# Altium schematic symbol library BARKO_SCHLIB.SchLib: 1064 symbols (part 1 of 11) (continued)
## C-1UF-0603 (continued)
CAP CER 1UF 16V X7R 0603; Manufacturer: TDK; Manufacturer Part Number: C1608X7R1C105K080AC; Dielectric Material: Ceramic; Tolerance: 10%; .PCBCHK: USED; .Creator: M.OZKAN; Washability: OK; Supplier 1: Digi-Key; Supplier Part Number 1: 445-1604-1-ND; Stock 1: 0; Pricing 1: 1=0.1, 10=0.076, 100=0.0338, 500=0.02418, 1000=0.019 (EUR); Mount: Surface Mount; Case/Package: 0603; Weight: 7.1E-05oz; Case Code (Metric): 1608; Min Operating Temperature: -55°C; Max Operating Temperature: 125°C; Packaging: Tape and Reel; Package Quantity: 1; Termination: SMD/SMT; Capacitance: 1uF; Voltage Rating (DC): 16V; Dielectric: X7R; Composition: Ceramic; Voltage: 16V; Length: 1.6mm; Height: 0.8mm; Width: 0.031inch; Thickness: 0.037inch; Depth: 0.8mm; Radiation Hardening: No; REACH SVHC: No SVHC; Lead Free: Lead Free; ComponentLink1URL: http://www.farnell.com/datasheets/1796654.pdf; ComponentLink1Description: http://www.farnell.com/datasheets/1796654.pdf; ComponentLink2URL: http://www.mouser.com/ds/2/400/lcc_commercial_general_en-837201.pdf; ComponentLink2Description: http://www.mouser.com/ds/2/400/lcc_commercial_general_en-837201.pdf; ComponentLink3URL: https://product.tdk.com/info/en/catalog/spec/mlccspec_commercial_general_midvoltage_en.pdf; ComponentLink3Description: https://product.tdk.com/info/en/catalog/spec/mlccspec_commercial_general_midvoltage_en.pdf; ComponentLink4URL: https://product.tdk.com/info/en/catalog/datasheets/mlcc_commercial_general_en.pdf; ComponentLink4Description: https://product.tdk.com/info/en/catalog/datasheets/mlcc_commercial_general_en.pdf; ComponentLink5URL: http://www.farnell.com/datasheets/1571323.pdf; ComponentLink5Description: http://www.farnell.com/datasheets/1571323.pdf; ComponentLink6URL: http://www.tdk.co.jp/tefe02/e412_c.pdf; ComponentLink6Description: http://www.tdk.co.jp/tefe02/e412_c.pdf; ComponentLink7URL: http://uk.rs-online.com/webdocs/1532/0900766b81532cd0.pdf; ComponentLink7Description: http://uk.rs-online.com/webdocs/1532/0900766b81532cd0.pdf; ComponentLink8URL: http://www.farnell.com/datasheets/1744655.pdf; ComponentLink8Description: http://www.farnell.com/datasheets/1744655.pdf; ComponentLink9URL: https://www.verical.com/server-webapp/html/getDatasheet?partID=715881; ComponentLink9Description: https://www.verical.com/server-webapp/html/getDatasheet?partID=715881; .SCHCHK: USED
footprint C-0603
pins: 1, 2

## C-1UF-0603_1
designator C?, comment 1UF  Voltage Rating: 50V  Case/Package: 0603
CAP CER 1UF 50V X7R 0603; Manufacturer: Yageo; Manufacturer Part Number: CC0603KRX7R9BB105; Tolerance: 10%; .PCBCHK: USED; .Creator: M.OZKAN; Washability: OK; Stock 1: 0; Mount: Surface Mount; Weight: 7.1E-05oz; Case Code (Metric): 1608; Case Code (Imperial): 0603; Min Operating Temperature: -55°C; Max Operating Temperature: 125°C; Capacitance: 1uF; Dielectric: X7R; Packaging: Tape and Reel; Termination: SMD/SMT; Composition: Ceramic; Voltage Rating (DC): 50V; Package Quantity: 4000; Length: 0.063inch; Width: 0.031inch; Thickness: 0.035inch; Lead Free: Lead Free; Halogen Free: Halogen Free; Stock 2: 0; Pricing 2: 1=0.29, 10=0.198, 100=0.1124, 500=0.07936, 1000=0.06943 (USD); Height: 0.8mm; Depth: 0.8mm; Radiation Hardening: No; ComponentLink1URL: https://www.yuden.co.jp/productdata/catalog/mlcc_all_e.pdf; ComponentLink1Description: https://www.yuden.co.jp/productdata/catalog/mlcc_all_e.pdf; Stock 3: 0; Pricing 3: 1=0.73, 10=0.519, 100=0.3416, 500=0.253, 1000=0.21505 (USD); ComponentLink2URL: http://datasheet.octopart.com/06035C105KAT2A-AVX-datasheet-13516023.pdf; ComponentLink2Description: http://datasheet.octopart.com/06035C105KAT2A-AVX-datasheet-13516023.pdf; .SCHCHK: USED; Supplier 1: Digi-Key; Supplier Part Number 1: 587-3247-6-ND
footprint C-0603
pins: 1, 2

## C-1UF-0805
designator C?, comment 1UF  Voltage Rating: 16V  Case/Package: 0805
CAP CER 1UF 16V X7R 0805; Manufacturer: Samsung; Manufacturer Part Number: CL21B105KOFNNNE; Tolerance: 10%; Dielectric Material: Ceramic; Dissipation Factor: 5%; .PCBCHK: USED; .Creator: M.OZKAN; Washability: OK; Stock 1: 0; Pricing 1: 1=0.1, 10=0.075, 100=0.0333, 500=0.0238, 1000=0.0187 (USD); Mount: Surface Mount; Case Code (Metric): 2012; Case Code (Imperial): 0805; Contact Plating: Tin; Min Operating Temperature: -55°C; Max Operating Temperature: 125°C; Package Quantity: 1; Packaging: Tape and Reel; Capacitance: 1uF; Dielectric: X7R; Voltage Rating (DC): 16V; Voltage: 16V; Length: 2mm; Height: 1.25mm; Width: 0.049inch; Thickness: 0.053inch; Depth: 1.25mm; Radiation Hardening: No; Lead Free: Lead Free; ComponentLink1URL: http://www.samsungsem.com/kr/support/product-search/mlcc/CL21B105KOFNNNE.jsp; ComponentLink1Description: http://www.samsungsem.com/kr/support/product-search/mlcc/CL21B105KOFNNNE.jsp; ComponentLink2URL: https://www.verical.com/server-webapp/html/getDatasheet?partID=358361; ComponentLink2Description: https://www.verical.com/server-webapp/html/getDatasheet?partID=358361; ComponentLink3URL: https://www.distrelec.biz/Web/Downloads/_e/ng/MLCC_CatalogDownload2013_ENG.pdf?mime=application%2Fpdf; ComponentLink3Description: https://www.distrelec.biz/Web/Downloads/_e/ng/MLCC_CatalogDownload2013_ENG.pdf?mime=application%2Fpdf; Stock 2: 20000; Pricing 2: 1=0.12, 10=0.087, 100=0.0387, 500=0.02766, 1000=0.02173 (USD); ComponentLink4URL: //media.digikey.com/pdf/Data%20Sheets/Samsung%20PDFs/CL21B105KOFNNWE_Character.pdf; ComponentLink4Description: //media.digikey.com/pdf/Data%20Sheets/Samsung%20PDFs/CL21B105KOFNNWE_Character.pdf; Stock 3: 40000; Pricing 3: 1=0.17, 10=0.124, 100=0.0581, 500=0.04076, 1000=0.03374 (USD); Number of Pins: 2; Termination: SMD/SMT; Lead Pitch: 0.75mm; REACH SVHC: No SVHC; ComponentLink5URL: http://www.alliedelec.com/m/d/9bfe7773041ffe9d406e68bc7b377fdd.pdf; ComponentLink5Description: http://www.alliedelec.com/m/d/9bfe7773041ffe9d406e68bc7b377fdd.pdf; ComponentLink6URL: http://www.farnell.com/datasheets/2123021.pdf; ComponentLink6Description: http://www.farnell.com/datasheets/2123021.pdf; ComponentLink7URL: http://www.farnell.com/datasheets/1851736.pdf; ComponentLink7Description: http://www.farnell.com/datasheets/1851736.pdf; ComponentLink8URL: http://www.onlinecomponents.com/productFiles/mf-KEM/docfinderpartnumberc0402c102k5ractu.pdf; ComponentLink8Description: http://www.onlinecomponents.com/productFiles/mf-KEM/docfinderpartnumberc0402c102k5ractu.pdf; .SCHCHK: USED; Supplier 1: Digi-Key; Supplier Part Number 1: 1276-2931-6-ND
footprint C-0805
pins: 1, 2

## C-1uF-0805-50V
designator C?, comment 1uF  Voltage: 50V  Case/Package: 0805
CAP CER 1UF 50V X7R 0805; Manufacturer: Samsung; Manufacturer Part Number: CL21B105KBFNNNE; Tolerance: 10%; Supplier 1: Digi-Key; Supplier Part Number 1: 1276-1029-1-ND; Stock: 731386; Pricing: 1=0.12, 10=0.085, 50=0.0482, 100=0.0399, 500=0.028, 1000=0.0232 (USD); RoHS: Yes; Mount: Surface Mount; Case Code (Imperial): 0805; Case Code (Metric): 2012; Min Operating Temperature: -55°C; Max Operating Temperature: 125°C; Packaging: Tape and Reel; Package Quantity: 1; Capacitance: 1uF; Voltage Rating: 50V; Dielectric: X7R; Length: 2mm; Height: 1.25mm; Width: 0.049inch; Thickness: 0.053inch; Depth: 1.25mm; Radiation Hardening: No; ComponentLink1URL: https://datasheet.ciiva.com/25800/cl21b105kbfnnne-25800291.pdf?src-supplier=Digi-Key; ComponentLink1Description: https://datasheet.ciiva.com/25800/cl21b105kbfnnne-25800291.pdf?src-supplier=Digi-Key; ComponentLink2URL: https://datasheet.ciiva.com/16449/cl21b105kbfnnne-16449003.pdf?src-supplier=Future+Electronics; ComponentLink2Description: https://datasheet.ciiva.com/16449/cl21b105kbfnnne-16449003.pdf?src-supplier=Future+Electronics; ComponentLink3URL: https://datasheet.ciiva.com/26838/getdatasheetpartid-354075-26838668.pdf?src-supplier=Verical; ComponentLink3Description: https://datasheet.ciiva.com/26838/getdatasheetpartid-354075-26838668.pdf?src-supplier=Verical
footprint C-0805
pins: 1, 2

## C-1UF-0805_1
designator C?, comment 1UF  Voltage Rating: 50V  Case/Package: 0805
CAP CER 1UF 50V X7R 0805; Manufacturer: Samsung; Manufacturer Part Number: CL21B105KBFNNNE; Tolerance: 10%; .PCBCHK: CHECKED; .Creator: M.OZKAN; Washability: OK; Stock 1: 20000; Pricing 1: 1=0.21, 10=0.151, 100=0.0712, 500=0.04994, 1000=0.04135 (USD); Mount: Surface Mount; Case Code (Metric): 2012; Case Code (Imperial): 0805; Min Operating Temperature: -55°C; Max Operating Temperature: 125°C; Packaging: Tape and Reel; Package Quantity: 1; Capacitance: 1uF; Dielectric: X7R; Length: 2mm; Height: 1.25mm; Width: 0.049inch; Thickness: 0.053inch; Depth: 1.25mm; Radiation Hardening: No; ComponentLink1URL: https://media.digikey.com/pdf/Data%20Sheets/Samsung%20PDFs/CL_Series_MLCC_ds.pdf; ComponentLink1Description: https://media.digikey.com/pdf/Data%20Sheets/Samsung%20PDFs/CL_Series_MLCC_ds.pdf; ComponentLink2URL: http://www1.futureelectronics.com/doc/SAMSUNG/CL21B105KBFNNNE.pdf; ComponentLink2Description: http://www1.futureelectronics.com/doc/SAMSUNG/CL21B105KBFNNNE.pdf; ComponentLink3URL: https://www.verical.com/server-webapp/html/getDatasheet?partID=354075; ComponentLink3Description: https://www.verical.com/server-webapp/html/getDatasheet?partID=354075; Voltage: 50V; Stock 2: 30000; Pricing 2: 1=0.34, 10=0.232, 100=0.1317, 500=0.09298, 1000=0.08135 (USD); Weight: 0.000194oz; Voltage Rating (DC): 50V; Termination: SMD/SMT; Composition: Ceramic; Lead Free: Lead Free; Halogen Free: Halogen Free; ComponentLink4URL: http://www.mouser.com/ds/2/447/Yageo_UPY-GP_NP0_16V-to-50V_9-358835.pdf; ComponentLink4Description: http://www.mouser.com/ds/2/447/Yageo_UPY-GP_NP0_16V-to-50V_9-358835.pdf; Stock 3: 20000; Pricing 3: 1=0.14, 10=0.099, 100=0.0468, 500=0.03278, 1000=0.02714 (USD); .SCHCHK: CHECKED; Supplier 1: Digi-Key; Supplier Part Number 1: 1276-1029-6-ND
footprint C-0805
pins: 1, 2

## C-1UF-1206
designator C?, comment 1UF  Voltage Rating: 100V  Case Code (Imperial): 1206
CAP CER 1UF 100V X7R 1206; Manufacturer: Samsung; Manufacturer Part Number: CL31B105KCHNNNE; Tolerance: 10%; .PCBCHK: CHECKED; .Creator: M.OZKAN; Washability: OK; Stock 1: 0; Pricing 1: 1=0.36, 10=0.251, 100=0.1506, 500=0.11298, 1000=0.0954 (USD); Mount: Surface Mount; Case/Package: 1206; Case Code (Metric): 3216; Contact Plating: Tin; Min Operating Temperature: -55°C; Max Operating Temperature: 125°C; Packaging: Tape and Reel; Capacitance: 1uF; Dielectric: X7R; Length: 3.2mm; Height: 1.6mm; Width: 0.063inch; Thickness: 0.071inch; Depth: 1.6mm; Radiation Hardening: No; ComponentLink1URL: http://www.samsungsem.com/kr/support/product-search/mlcc/CL31B105KCHNNNE.jsp; ComponentLink1Description: http://www.samsungsem.com/kr/support/product-search/mlcc/CL31B105KCHNNNE.jsp; ComponentLink2URL: http://www1.futureelectronics.com/doc/SAMSUNG/CLSERIES.pdf; ComponentLink2Description: http://www1.futureelectronics.com/doc/SAMSUNG/CLSERIES.pdf; Stock 2: 142; Pricing 2: 1=1.2, 10=0.949, 100=0.7116, 500=0.53762, 1000=0.47438 (USD); Voltage Rating (DC): 100V; Package Quantity: 2000; Termination: SMD/SMT; ComponentLink3URL: http://www.mouser.com/ds/2/40/LD-Series-777051.pdf; ComponentLink3Description: http://www.mouser.com/ds/2/40/LD-Series-777051.pdf; Stock 3: 0; Pricing 3: 1=0.51, 10=0.36, 100=0.2368, 500=0.17538, 1000=0.14907 (USD); Weight: 0.000571oz; Composition: Ceramic; Voltage: 100V; REACH SVHC: No SVHC; Lead Free: Lead Free; ComponentLink4URL: http://www.mouser.com/ds/2/400/lcc_commercial_highvoltage_en-520036.pdf; ComponentLink4Description: http://www.mouser.com/ds/2/400/lcc_commercial_highvoltage_en-520036.pdf; ComponentLink5URL: http://uk.rs-online.com/webdocs/1532/0900766b81532cd0.pdf; ComponentLink5Description: http://uk.rs-online.com/webdocs/1532/0900766b81532cd0.pdf; ComponentLink6URL: http://www.farnell.com/datasheets/1484596.pdf; ComponentLink6Description: http://www.farnell.com/datasheets/1484596.pdf; ComponentLink7URL: http://product.tdk.com/en/catalog/datasheets/mlcc_commercial_midvoltage_en.pdf; ComponentLink7Description: http://product.tdk.com/en/catalog/datasheets/mlcc_commercial_midvoltage_en.pdf; .SCHCHK: CHECKED; Supplier 1: Digi-Key; Supplier Part Number 1: 1276-1838-6-ND
footprint C-1206
pins: 1, 2

## C-1UF-1206 TANT
designator C?, comment 1UF  Case/Package: 1206  Voltage Rating: 16V
CAP TANT 1UF 10% 16V 1206; Manufacturer: KEMET; Manufacturer Part Number: T491A105K016AT; Dielectric Material: Tantalum; Tolerance: 20%; ESR (Equivalent Series Resistance): 10R; Polarity: Polar; Dissipation Factor: 4%; Leakage Current: 500nA; Life (Hours): 2000Hour; Ripple Current: 87mA; Washability: OK; .Creator: M.OZKAN; .PCBCHK: USED; Supplier 1: Digi-Key; Stock 1: 200977; Pricing 1: 1=0.42000, 10=0.29000, 100=0.17390, 500=0.13042, 1000=0.11012 (USD); RoHS: Yes; Mount: Surface Mount; Number of Pins: 2; Case Code (Imperial): 1206; Case Code (Metric): 3216; Min Operating Temperature: -55°C; Max Operating Temperature: 125°C; Capacitance: 1uF; Packaging: Tape and Reel; Package Quantity: 1; Voltage Rating (DC): 16V; Termination: SMD/SMT; Voltage: 16V; Features: General Purpose; Length: 3.2mm; Height: 1.6mm; Depth: 1.6mm; Width: 1.6mm; Height - Seated (Max): 0.071inch; REACH SVHC: No SVHC; Lead Free: Lead Free; ComponentLink1URL: https://datasheet.ciiva.com/7696/1732736-7696289.pdf?src-supplier=Element14; ComponentLink1Description: https://datasheet.ciiva.com/7696/1732736-7696289.pdf?src-supplier=Element14; ComponentLink2URL: https://datasheet.ciiva.com/20171/458280-da-en-01-20171909.pdf?src-supplier=Rapid+Electronics; ComponentLink2Description: https://datasheet.ciiva.com/20171/458280-da-en-01-20171909.pdf?src-supplier=Rapid+Electronics; ComponentLink3URL: https://datasheet.ciiva.com/34302/1573169-34302502.pdf?src-supplier=Jameco; ComponentLink3Description: https://datasheet.ciiva.com/34302/1573169-34302502.pdf?src-supplier=Jameco; ComponentLink4URL: https://datasheet.ciiva.com/11793/0900766b80718482-11793119.pdf?src-supplier=RSComponents; ComponentLink4Description: https://datasheet.ciiva.com/11793/0900766b80718482-11793119.pdf?src-supplier=RSComponents; ComponentLink5URL: https://datasheet.ciiva.com/5934/kem-t2005-t491-5934792.pdf?src-supplier=Farnell; ComponentLink5Description: https://datasheet.ciiva.com/5934/kem-t2005-t491-5934792.pdf?src-supplier=Farnell; ComponentLink6URL: https://datasheet.ciiva.com/12882/kem-t2005-t491-12882490.pdf?src-supplier=Mouser; ComponentLink6Description: https://datasheet.ciiva.com/12882/kem-t2005-t491-12882490.pdf?src-supplier=Mouser; ComponentLink7URL: https://datasheet.ciiva.com/32431/t491a105k016zt-eng-tds-32431595.pdf?src-supplier=Distrelec; ComponentLink7Description: https://datasheet.ciiva.com/32431/t491a105k016zt-eng-tds-32431595.pdf?src-supplier=Distrelec; ComponentLink8URL: https://datasheet.ciiva.com/257/kem-t2005-t491-257404.pdf?src-supplier=Digi-Key; ComponentLink8Description: https://datasheet.ciiva.com/257/kem-t2005-t491-257404.pdf?src-supplier=Digi-Key; ComponentLink9URL: https://datasheet.ciiva.com/257/kem-t2005-t491-257405.pdf?src-supplier=Digi-Key; ComponentLink9Description: https://datasheet.ciiva.com/257/kem-t2005-t491-257405.pdf?src-supplier=Digi-Key; ComponentLink10URL: https://datasheet.ciiva.com/7696/kem-t2005-t491-7696429.pdf?src-supplier=Element14; ComponentLink10Description: https://datasheet.ciiva.com/7696/kem-t2005-t491-7696429.pdf?src-supplier=Element14; ComponentLink11URL: https://datasheet.ciiva.com/257/kem-t2005-t491-257406.pdf?src-supplier=Digi-Key; ComponentLink11Description: https://datasheet.ciiva.com/257/kem-t2005-t491-257406.pdf?src-supplier=Digi-Key; ComponentLink12URL: https://datasheet.ciiva.com/14595/70095774-14595055.pdf?src-supplier=Allied+Electronics; ComponentLink12Description: https://datasheet.ciiva.com/14595/70095774-14595055.pdf?src-supplier=Allied+Electronics; Supplier Part Number 1: 399-3678-1-ND; Radiation Hardening: No; ComponentLink13URL: https://datasheet.ciiva.com/34302/1573425-34302513.pdf?src-supplier=Jameco; ComponentLink13Description: https://datasheet.ciiva.com/34302/1573425-34302513.pdf?src-supplier=Jameco; ComponentLink14URL: https://datasheet.ciiva.com/20171/458253-da-en-01-20171911.pdf?src-supplier=Rapid+Electronics; ComponentLink14Description: https://datasheet.ciiva.com/20171/458253-da-en-01-20171911.pdf?src-supplier=Rapid+Electronics; ComponentLink15URL: https://datasheet.ciiva.com/11793/0900766b80718482-11793043.pdf?src-supplier=RSComponents; ComponentLink15Description: https://datasheet.ciiva.com/11793/0900766b80718482-11793043.pdf?src-supplier=RSComponents; ComponentLink16URL: https://datasheet.ciiva.com/257/kem-t2005-t491-257537.pdf?src-supplier=Digi-Key; ComponentLink16Description: https://datasheet.ciiva.com/257/kem-t2005-t491-257537.pdf?src-supplier=Digi-Key; ComponentLink17URL: https://datasheet.ciiva.com/7696/1854511-7696309.pdf?src-supplier=Element14; ComponentLink17Description: https://datasheet.ciiva.com/7696/1854511-7696309.pdf?src-supplier=Element14; ComponentLink18URL: https://datasheet.ciiva.com/7696/1854511-7696312.pdf?src-supplier=Element14; ComponentLink18Description: https://datasheet.ciiva.com/7696/1854511-7696312.pdf?src-supplier=Element14; ComponentLink19URL: https://datasheet.ciiva.com/257/kem-t2005-t491-257536.pdf?src-supplier=Digi-Key; ComponentLink19Description: https://datasheet.ciiva.com/257/kem-t2005-t491-257536.pdf?src-supplier=Digi-Key; ComponentLink20URL: https://datasheet.ciiva.com/257/kem-t2005-t491-257538.pdf?src-supplier=Digi-Key; ComponentLink20Description: https://datasheet.ciiva.com/257/kem-t2005-t491-257538.pdf?src-supplier=Digi-Key; ComponentLink21URL: https://datasheet.ciiva.com/14605/70095774-14605189.pdf?src-supplier=Allied+Electronics; ComponentLink21Description: https://datasheet.ciiva.com/14605/70095774-14605189.pdf?src-supplier=Allied+Electronics; ComponentLink22URL: https://datasheet.ciiva.com/7696/1854511-7696310.pdf?src-supplier=Element14; ComponentLink22Description: https://datasheet.ciiva.com/7696/1854511-7696310.pdf?src-supplier=Element14; ComponentLink23URL: https://datasheet.ciiva.com/7696/1854511-7696311.pdf?src-supplier=Element14; ComponentLink23Description: https://datasheet.ciiva.com/7696/1854511-7696311.pdf?src-supplier=Element14; ComponentLink24URL: https://datasheet.ciiva.com/12883/kem-t2005-t491-12883130.pdf?src-supplier=Mouser; ComponentLink24Description: https://datasheet.ciiva.com/12883/kem-t2005-t491-12883130.pdf?src-supplier=Mouser; ComponentLink25URL: https://datasheet.ciiva.com/14603/70095774-14603739.pdf?src-supplier=Allied+Electronics; ComponentLink25Description: https://datasheet.ciiva.com/14603/70095774-14603739.pdf?src-supplier=Allied+Electronics; ComponentLink26URL: https://datasheet.ciiva.com/5934/kem-t2005-t491-5934799.pdf?src-supplier=Farnell; ComponentLink26Description: https://datasheet.ciiva.com/5934/kem-t2005-t491-5934799.pdf?src-supplier=Farnell; ComponentLink27URL: https://datasheet.ciiva.com/29244/458253-da-01-en-tantal-kondensator-t491a475k016at-29244572.pdf?src-supplier=Conrad; ComponentLink27Description: https://datasheet.ciiva.com/29244/458253-da-01-en-tantal-kondensator-t491a475k016at-29244572.pdf?src-supplier=Conrad; .SCHCHK: USED
footprint C-TANTA-3216
pins: 1, 2
text: +

## C-1UF-1206_1
designator C?, comment 1UF  Voltage Rating: 50V  Case Code (Imperial): 1206
CAP CER 1UF 50V X7R 1206; Manufacturer: Samsung; Manufacturer Part Number: CL31B105KBHNNNE; Material: Ceramic; Tolerance: 10%; .PCBCHK: USED; .Creator: F:TALI; Washability: OK; ComponentLink1URL: http://www.samsungsem.com/kr/support/product-search/mlcc/CL31B105KCHNNNE.jsp; ComponentLink1Description: http://www.samsungsem.com/kr/support/product-search/mlcc/CL31B105KCHNNNE.jsp; ComponentLink2URL: http://www1.futureelectronics.com/doc/SAMSUNG/CLSERIES.pdf; ComponentLink2Description: http://www1.futureelectronics.com/doc/SAMSUNG/CLSERIES.pdf; Stock 1: 0; Pricing 1: 1=0.21, 10=0.145, 100=0.0736, 500=0.05038, 1000=0.04456 (USD); Mount: Surface Mount; Case/Package: 1206; Contact Plating: Tin; Case Code (Metric): 3216; Min Operating Temperature: -55°C; Max Operating Temperature: 125°C; Packaging: Tape and Reel; Package Quantity: 1; Capacitance: 1uF; Dielectric: X7R; Voltage: 50V; Voltage Rating (DC): 50V; Length: 3.2mm; Height: 1.6mm; Width: 0.063inch; Thickness: 0.071inch; Depth: 1.6mm; Radiation Hardening: No; Lead Free: Lead Free; ComponentLink3URL: http://www1.futureelectronics.com/doc/SAMSUNG/CL31B105KBHNNNE.pdf; ComponentLink3Description: http://www1.futureelectronics.com/doc/SAMSUNG/CL31B105KBHNNNE.pdf; ComponentLink4URL: https://media.digikey.com/pdf/Data%20Sheets/Samsung%20PDFs/CL_Series_MLCC_ds.pdf; ComponentLink4Description: https://media.digikey.com/pdf/Data%20Sheets/Samsung%20PDFs/CL_Series_MLCC_ds.pdf; ComponentLink5URL: https://www.verical.com/server-webapp/html/getDatasheet?partID=357471; ComponentLink5Description: https://www.verical.com/server-webapp/html/getDatasheet?partID=357471; ComponentLink6URL: http://www.rapidonline.com/pdf/71-0873.pdf; ComponentLink6Description: http://www.rapidonline.com/pdf/71-0873.pdf; ComponentLink7URL: https://produktinfo.conrad.com/datenblaetter/450000-474999/453294-da-01-en-VS_KONDENSATOR_1206.pdf; ComponentLink7Description: https://produktinfo.conrad.com/datenblaetter/450000-474999/453294-da-01-en-VS_KONDENSATOR_1206.pdf; Stock 2: 20000; Pricing 2: 1=0.38, 10=0.262, 100=0.1573, 500=0.118, 1000=0.09964 (USD); Weight: 0.000571oz; Termination: SMD/SMT; Composition: Ceramic; Ratings: AEC-Q200; REACH SVHC: No SVHC; ComponentLink8URL: http://www.farnell.com/datasheets/1796654.pdf; ComponentLink8Description: http://www.farnell.com/datasheets/1796654.pdf; ComponentLink9URL: http://www.mouser.com/ds/2/400/lcc_automotive_general_en-843974.pdf; ComponentLink9Description: http://www.mouser.com/ds/2/400/lcc_automotive_general_en-843974.pdf; Stock 3: 25000; Pricing 3: 1=0.41, 10=0.28, 100=0.1586, 500=0.11194, 1000=0.09795 (USD); Dielectric Material: Ceramic; ComponentLink10URL: https://search.kemet.com/component-edge/download/datasheet/C1206C105K5RACAUTO.pdf; ComponentLink10Description: https://search.kemet.com/component-edge/download/datasheet/C1206C105K5RACAUTO.pdf; ComponentLink11URL: http://www.farnell.com/datasheets/1776108.pdf; ComponentLink11Description: http://www.farnell.com/datasheets/1776108.pdf; ComponentLink12URL: https://www.verical.com/server-webapp/html/getDatasheet?partID=510363; ComponentLink12Description: https://www.verical.com/server-webapp/html/getDatasheet?partID=510363; .SCHCHK: USED; Supplier 1: Digi-Key; Supplier Part Number 1: 1276-1068-6-ND
footprint C-1206
pins: 1, 2

## C-1UF-1210
designator C?, comment 1UF  Voltage: 100V  Case/Package: 1210
CAP CER 1UF 100V X7R 1210; Manufacturer: Kyocera AVX; Manufacturer Part Number: 12101C105KAT2A; Tolerance: 20%; Dissipation Factor: 2.5%; Washability: OK; .Creator: M.OZKAN; .PCBCHK: USED; Supplier 1: Digi-Key; Stock 1: 65698; Pricing 1: 1=0.69000, 10=0.48500, 100=0.31970, 500=0.23680 (USD); RoHS: Yes; Mount: Surface Mount,PCB; Case Code (Imperial): 1210; Case Code (Metric): 3225; Contact Plating: Tin,Matte; Min Operating Temperature: -55°C; Max Operating Temperature: 125°C; Capacitance: 1uF; Dielectric: X7R; Packaging: Tape and Reel; Voltage Rating (DC): 100V; Voltage Rating: 100V; Package Quantity: 1; Termination: SMD/SMT; Length: 3.2mm; Height: 2.79mm; Depth: 2.5mm; Width: 2.5mm; Thickness: 0.11inch; Radiation Hardening: No; REACH SVHC: No SVHC; Lead Free: Lead Free; ComponentLink1URL: https://datasheet.ciiva.com/11788/0900766b80dc2409-11788594.pdf?src-supplier=RSComponents; ComponentLink1Description: https://datasheet.ciiva.com/11788/0900766b80dc2409-11788594.pdf?src-supplier=RSComponents; ComponentLink2URL: https://datasheet.ciiva.com/5419/cx7r-218113-5419973.pdf?src-supplier=Mouser; ComponentLink2Description: https://datasheet.ciiva.com/5419/cx7r-218113-5419973.pdf?src-supplier=Mouser; ComponentLink3URL: https://datasheet.ciiva.com/153/cx7r-153753.pdf?src-supplier=Digi-Key; ComponentLink3Description: https://datasheet.ciiva.com/153/cx7r-153753.pdf?src-supplier=Digi-Key; ComponentLink4URL: https://datasheet.ciiva.com/153/cx7r-153754.pdf?src-supplier=Digi-Key; ComponentLink4Description: https://datasheet.ciiva.com/153/cx7r-153754.pdf?src-supplier=Digi-Key; ComponentLink5URL: https://datasheet.ciiva.com/7709/1679506-7709578.pdf?src-supplier=Element14; ComponentLink5Description: https://datasheet.ciiva.com/7709/1679506-7709578.pdf?src-supplier=Element14; ComponentLink6URL: https://datasheet.ciiva.com/14590/70001075-14590234.pdf?src-supplier=Allied+Electronics; ComponentLink6Description: https://datasheet.ciiva.com/14590/70001075-14590234.pdf?src-supplier=Allied+Electronics; ComponentLink7URL: https://datasheet.ciiva.com/153/cx7r-153755.pdf?src-supplier=Digi-Key; ComponentLink7Description: https://datasheet.ciiva.com/153/cx7r-153755.pdf?src-supplier=Digi-Key; ComponentLink8URL: https://datasheet.ciiva.com/7709/1679506-7709579.pdf?src-supplier=Element14; ComponentLink8Description: https://datasheet.ciiva.com/7709/1679506-7709579.pdf?src-supplier=Element14; ComponentLink9URL: https://datasheet.ciiva.com/7709/1679506-7709580.pdf?src-supplier=Element14; ComponentLink9Description: https://datasheet.ciiva.com/7709/1679506-7709580.pdf?src-supplier=Element14; ComponentLink10URL: https://datasheet.ciiva.com/14599/70001075-14599678.pdf?src-supplier=Allied+Electronics; ComponentLink10Description: https://datasheet.ciiva.com/14599/70001075-14599678.pdf?src-supplier=Allied+Electronics; Supplier Part Number 1: 478-2570-1-ND; .SCHCHK: USED
footprint C-1210
pins: 1, 2

## C-1UF-1812
designator C?, comment 1uF  Voltage Rating: 250V  Case/Package: 1812
CAP CER 1UF 250V X7T 1812; Manufacturer: TDK; Manufacturer Part Number: CGA8P3X7T2E105K250KA; Tolerance: 10%; Supplier 1: Digi-Key; Supplier Part Number 1: 445-7925-1-ND; Stock: 15128; Pricing: 1=1.14, 10=0.901, 50=0.7808, 100=0.6757 (USD); RoHS: Yes; Mount: Surface Mount; Weight: 0.000952oz; Case Code (Metric): 4532; Case Code (Imperial): 1812; Min Operating Temperature: -55°C; Max Operating Temperature: 125°C; Packaging: Tape and Reel; Capacitance: 1uF; Termination: SMD/SMT; Package Quantity: 1; Voltage Rating (DC): 250V; Resistor Type: Ceramic; Dielectric: X7T; Length: 4.5mm; Height: 2.5mm; Width: 0.126inch; Thickness: 0.098inch; Depth: 3.2mm; Ratings: AEC-Q200; REACH SVHC: No SVHC; ComponentLink1URL: https://datasheet.ciiva.com/46443/1839935-46443596.pdf?src-supplier=Element14; ComponentLink1Description: https://datasheet.ciiva.com/46443/1839935-46443596.pdf?src-supplier=Element14; ComponentLink2URL: https://datasheet.ciiva.com/46443/1839935-46443597.pdf?src-supplier=Element14; ComponentLink2Description: https://datasheet.ciiva.com/46443/1839935-46443597.pdf?src-supplier=Element14
footprint C-1812
pins: 1, 2

## C-2N2F-0402
designator C?, comment 2N2F  Case/Package: 0402  Voltage Rating: 16V
CAP CER 2200PF 16V X7R 0402; Manufacturer: KEMET; Manufacturer Part Number: C0402C222K4RACTU; Dielectric Material: Ceramic; Capacitance: 2.2nF; Tolerance: 10%; Dissipation Factor: 3.5%; .PCBCHK: USED; .Creator: F:TALI; Resistance: 33R; Temperature Coefficient: 100ppm/°C; Power Rating: 100mW; Washability: OK; Stock 1: 8726; Pricing 1: 1=0.48, 10=0.333, 100=0.1997, 500=0.14976, 1000=0.12647, 2500=0.11981, 5000=0.11316 (USD); Mount: Surface Mount; Case Code (Metric): 1005; Min Operating Temperature: -55°C; Max Operating Temperature: 125°C; Packaging: Tape and Reel; Voltage Rating (DC): 16V; Dielectric: X7R; Package Quantity: 10000; Termination: SMD/SMT; Length: 1mm; Height: 0.5mm; Depth: 0.5mm; Width: 0.02inch; Thickness: 0.022inch; Lead Pitch: 0.3mm; Radiation Hardening: No; Case Code (Imperial): 0402; Stock 2: 277; Pricing 2: 1=0.1, 10=0.071, 100=0.0314, 500=0.02244, 1000=0.01763, 2500=0.01603, 5000=0.01475 (USD); Stock 3: 1966; Pricing 3: 1=0.1, 10=0.013, 100=0.0113, 500=0.00998 (USD); .SCHCHK: USED; RoHS: Yes; Number of Pins: 2; Contact Plating: Tin; Composition: Thick Film; Military Standard: Not; Number of Terminations: 2; Max Power Dissipation: 100mW; Features: Automotive AEC-Q200; REACH SVHC: No SVHC; Lead Free: Lead Free; ComponentLink1URL: http://www.farnell.com/datasheets/1911175.pdf?src-supplier=Farnell; ComponentLink1Description: http://www.farnell.com/datasheets/1911175.pdf?src-supplier=Farnell; ComponentLink2URL: http://industrial.panasonic.com/www-data/pdf/AOA0000/AOA0000CE2.pdf?src-supplier=Farnell; ComponentLink2Description: http://industrial.panasonic.com/www-data/pdf/AOA0000/AOA0000CE2.pdf?src-supplier=Farnell; ComponentLink3URL: https://industrial.panasonic.com/cdbs/www-data/pdf/RDA0000/DMA0000COL11.pdf?src-supplier=Allied+Electronics; ComponentLink3Description: https://industrial.panasonic.com/cdbs/www-data/pdf/RDA0000/DMA0000COL11.pdf?src-supplier=Allied+Electronics; ComponentLink4URL: http://www.farnell.com/datasheets/1911175.pdf?src-supplier=Element14; ComponentLink4Description: http://www.farnell.com/datasheets/1911175.pdf?src-supplier=Element14; ComponentLink5URL: http://industrial.panasonic.com/www-data/pdf/AOA0000/AOA0000CE2.pdf?src-supplier=Element14; ComponentLink5Description: http://industrial.panasonic.com/www-data/pdf/AOA0000/AOA0000CE2.pdf?src-supplier=Element14; ComponentLink6URL: https://industrial.panasonic.com/cdbs/www-data/pdf/RDA0000/DMA0000COL11.pdf?src-supplier=Avnet; ComponentLink6Description: https://industrial.panasonic.com/cdbs/www-data/pdf/RDA0000/DMA0000COL11.pdf?src-supplier=Avnet; ComponentLink7URL: http://industrial.panasonic.com/www-data/pdf/AOA0000/AOA0000CE2.pdf?src-supplier=Avnet+Europe; ComponentLink7Description: http://industrial.panasonic.com/www-data/pdf/AOA0000/AOA0000CE2.pdf?src-supplier=Avnet+Europe; ComponentLink8URL: http://www.farnell.com/datasheets/426256.pdf?src-supplier=Element14; ComponentLink8Description: http://www.farnell.com/datasheets/426256.pdf?src-supplier=Element14; ComponentLink9URL: https://industrial.panasonic.com/cdbs/www-data/pdf/RDA0000/DMA0000COL11.pdf?src-supplier=Avnet+Asia; ComponentLink9Description: https://industrial.panasonic.com/cdbs/www-data/pdf/RDA0000/DMA0000COL11.pdf?src-supplier=Avnet+Asia; ComponentLink10URL: https://industrial.panasonic.com/cdbs/www-data/pdf/RDA0000/DMA0000COL11.pdf?src-supplier=Mouser; ComponentLink10Description: https://industrial.panasonic.com/cdbs/www-data/pdf/RDA0000/DMA0000COL11.pdf?src-supplier=Mouser; Supplier 1: Digi-Key; Supplier Part Number 1: 399-7778-6-ND
footprint C-0402
pins: 1, 2

## C-2N2F-0402-1
designator C?, comment 2N2F  Voltage Rating: 50V  Case/Package: 0402
CAP CER 2200PF 50V X7R 0402; Manufacturer: Murata; Manufacturer Part Number: GCM155R71H222KA37D; Capacitance: 2.2nF; Tolerance: 10%; .Creator: F:TALI; .PCBCHK: USED; Washability: OK; Supplier 1: Digi-Key; Stock 1: 2634889; Pricing 1: 1 = 0.10000, 10 = 0.05100, 100 = 0.02280, 500 = 0.01630, 1000 = 0.01281, 2500 = 0.01164, 5000 = 0.01071 (USD); RoHS: Yes; Mount: Surface Mount; Weight: 2.3E-05oz; Case Code (Metric): 1005; Case Code (Imperial): 0402; Min Operating Temperature: -55°C; Max Operating Temperature: 125°C; Dielectric: X7R; Packaging: Tape and Reel; Package Quantity: 1; Voltage Rating (DC): 50V; Termination: SMD/SMT; Voltage: 50V; Length: 1mm; Height: 0.5mm; Width: 0.02inch; Thickness: 0.022inch; Depth: 0.5mm; Ratings: AEC-Q200; Radiation Hardening: No; Lead Free: Lead Free; ComponentLink1URL: http://psearch.murata.com/capacitor/product/GCM155R71H222KA37%23.pdf?src-supplier=Avnet; ComponentLink1Description: http://psearch.murata.com/capacitor/product/GCM155R71H222KA37%23.pdf?src-supplier=Avnet; ComponentLink2URL: http://psearch.murata.com/capacitor/product/GCM155R71H222KA37%23.pdf?src-supplier=Avnet+Europe; ComponentLink2Description: http://psearch.murata.com/capacitor/product/GCM155R71H222KA37%23.pdf?src-supplier=Avnet+Europe; ComponentLink3URL: https://psearch.en.murata.com/capacitor/product/GCM155R71H222KA37%23.pdf?src-supplier=Digi-Key; ComponentLink3Description: https://psearch.en.murata.com/capacitor/product/GCM155R71H222KA37%23.pdf?src-supplier=Digi-Key; ComponentLink4URL: http://search.murata.co.jp/Ceramy/image/img/A01X/partnumbering_e_02.pdf?src-supplier=Digi-Key; ComponentLink4Description: http://search.murata.co.jp/Ceramy/image/img/A01X/partnumbering_e_02.pdf?src-supplier=Digi-Key; ComponentLink5URL: https://www.verical.com/server-webapp/html/getDatasheet?partID=692458&src-supplier=Verical; ComponentLink5Description: https://www.verical.com/server-webapp/html/getDatasheet?partID=692458&src-supplier=Verical; Supplier Part Number 1: 490-4914-1-ND; .SCHCHK: USED
footprint C-0402
pins: 1, 2

## C-2P7F-0402
designator C?, comment 2P7F  Voltage Rating: 50V  Case/Package: 0402
CAP CER 2.7PF 50V C0G/NP0 0402; Manufacturer: Murata; Manufacturer Part Number: GJM1555C1H2R7BB01D; Dielectric: C0G; Temperature Coefficient: 30ppm/°C; Washability: OK; .Creator: M.OZKAN; .PCBCHK: USED; RoHS: No; Mount: Surface Mount; Case Code (Imperial): 0402; Case Code (Metric): 1005; Min Operating Temperature: -55°C; Max Operating Temperature: 125°C; Packaging: Tape and Reel; Capacitance: 2.7pF; Ratings: AEC-Q200; ComponentLink1URL: http://search.murata.co.jp/Ceramy/image/img/A01X/G101/ENG/GCM1555C1H2R7BA16-01.pdf?src-supplier=Digi-Key; ComponentLink1Description: http://search.murata.co.jp/Ceramy/image/img/A01X/G101/ENG/GCM1555C1H2R7BA16-01.pdf?src-supplier=Digi-Key; Supplier: Digi-Key; Stock: 75703; Pricing: 1=0,19000, 10=0,13000, 100=0,06590, 500=0,04508, 1000=0,03987, 2500=0,03814, 5000=0,03467 (USD); Number of Pins: 2; Voltage Rating (DC): 50V; Termination: SMD/SMT; Voltage: 50V; Package Quantity: 10000; Length: 1mm; Height: 0.5mm; Thickness: 0.022inch; Depth: 0.5mm; Lead Pitch: 0.3mm; Width: 0.02inch; Radiation Hardening: No; Lead Free: Lead Free; REACH SVHC: No SVHC; ComponentLink2URL: https://datasheet.ciiva.com/8030/1700194-8030117.pdf?src-supplier=Element14; ComponentLink2Description: https://datasheet.ciiva.com/8030/1700194-8030117.pdf?src-supplier=Element14; ComponentLink3URL: https://datasheet.ciiva.com/17453/product-17453493.pdf?src-supplier=Avnet+Europe; ComponentLink3Description: https://datasheet.ciiva.com/17453/product-17453493.pdf?src-supplier=Avnet+Europe; ComponentLink4URL: https://datasheet.ciiva.com/18183/getdatasheetpartid-487665-18183834.pdf?src-supplier=Verical; ComponentLink4Description: https://datasheet.ciiva.com/18183/getdatasheetpartid-487665-18183834.pdf?src-supplier=Verical; ComponentLink5URL: https://datasheet.ciiva.com/5694/1700194-5694983.pdf?src-supplier=Farnell; ComponentLink5Description: https://datasheet.ciiva.com/5694/1700194-5694983.pdf?src-supplier=Farnell; ComponentLink6URL: https://datasheet.ciiva.com/29541/partnumbering-e-01-29541982.pdf?src-supplier=Digi-Key; ComponentLink6Description: https://datasheet.ciiva.com/29541/partnumbering-e-01-29541982.pdf?src-supplier=Digi-Key; ComponentLink7URL: https://datasheet.ciiva.com/16440/l0005e-16440479.pdf?src-supplier=Future+Electronics; ComponentLink7Description: https://datasheet.ciiva.com/16440/l0005e-16440479.pdf?src-supplier=Future+Electronics; ComponentLink8URL: https://datasheet.ciiva.com/29541/partnumbering-e-01-29541983.pdf?src-supplier=Digi-Key; ComponentLink8Description: https://datasheet.ciiva.com/29541/partnumbering-e-01-29541983.pdf?src-supplier=Digi-Key; Supplier Part Number: 490-8094-1-ND; .SCHCHK: USED
footprint C-0402
pins: 1, 2

## C-2U2F-0603
designator C?, comment 2U2F  Voltage Rating: 10V  Case/Package: 0603
CAP CER 2.2UF 10V X5R 0603; Manufacturer: Samsung; Manufacturer Part Number: CL10A225KP8NNNC; Material: Ceramic; Tolerance: 10%; Insulation Resistance: 10GR; .PCBCHK: USED; .Creator: F:TALI; Washability: OK; Stock 1: 0; Pricing 1: 1=0.12, 10=0.087, 100=0.0386, 500=0.02756, 1000=0.02166 (USD); Mount: Surface Mount; Case Code (Metric): 1608; Case Code (Imperial): 0603; Min Operating Temperature: -55°C; Max Operating Temperature: 85°C; Package Quantity: 1; Packaging: Tape and Reel; Capacitance: 2.2uF; Dielectric: X5R; Voltage: 10V; Voltage Rating (DC): 10V; Length: 1.6mm; Height: 0.8mm; Width: 0.031inch; Thickness: 0.035inch; Radiation Hardening: No; Lead Free: Lead Free; ComponentLink1URL: http://www.samsungsem.com/kr/support/library/product-catalog/mlcc.jsp; ComponentLink1Description: http://www.samsungsem.com/kr/support/library/product-catalog/mlcc.jsp; ComponentLink2URL: https://www.verical.com/server-webapp/html/getDatasheet?partID=358617; ComponentLink2Description: https://www.verical.com/server-webapp/html/getDatasheet?partID=358617; ComponentLink3URL: https://produktinfo.conrad.com/datenblaetter/450000-474999/457945-da-01-en-VS_KONDENSATOR_0603.pdf; ComponentLink3Description: https://produktinfo.conrad.com/datenblaetter/450000-474999/457945-da-01-en-VS_KONDENSATOR_0603.pdf; Depth: 0.8mm; Stock 2: 0; Pricing 2: 1=0.28, 10=0.194, 100=0.0982, 500=0.06716, 1000=0.05941 (USD); Number of Pins: 2; Termination: SMD/SMT; Composition: Ceramic; Dissipation Factor: 10%; REACH SVHC: No SVHC; Halogen Free: Halogen Free; ComponentLink4URL: http://www.yageo.com/documents/recent/UPY-GPHC_X5R_4V-to-50V_25.pdf; ComponentLink4Description: http://www.yageo.com/documents/recent/UPY-GPHC_X5R_4V-to-50V_25.pdf; ComponentLink5URL: http://www.farnell.com/datasheets/1525783.pdf; ComponentLink5Description: http://www.farnell.com/datasheets/1525783.pdf; ComponentLink6URL: http://www.yageo.com/documents/recent/UPY-GPHC_X5R_4V-to-50V_12.pdf; ComponentLink6Description: http://www.yageo.com/documents/recent/UPY-GPHC_X5R_4V-to-50V_12.pdf; ComponentLink7URL: http://www.farnell.com/datasheets/1359354.pdf; ComponentLink7Description: http://www.farnell.com/datasheets/1359354.pdf; Stock 3: 0; Pricing 3: 1=0.3, 10=0.203, 100=0.1027, 500=0.07026, 1000=0.06216 (USD); Dielectric Material: Ceramic; Lead Pitch: 0.7mm; ComponentLink8URL: https://www.verical.com/server-webapp/html/getDatasheet?partID=104076; ComponentLink8Description: https://www.verical.com/server-webapp/html/getDatasheet?partID=104076; ComponentLink9URL: http://www.farnell.com/datasheets/40889.pdf; ComponentLink9Description: http://www.farnell.com/datasheets/40889.pdf; ComponentLink10URL: http://www.alliedelec.com/m/d/9bfe7773041ffe9d406e68bc7b377fdd.pdf; ComponentLink10Description: http://www.alliedelec.com/m/d/9bfe7773041ffe9d406e68bc7b377fdd.pdf; ComponentLink11URL: http://www.kemet.com/kemet/web/homepage/kechome.nsf/vapubfiles/KEM_C1006_X5R_SMD.pdf/$file/KEM_C1006_X5R_SMD.pdf; ComponentLink11Description: http://www.kemet.com/kemet/web/homepage/kechome.nsf/vapubfiles/KEM_C1006_X5R_SMD.pdf/$file/KEM_C1006_X5R_SMD.pdf; .SCHCHK: USED; Supplier 1: Digi-Key; Supplier Part Number 1: 1276-1085-6-ND
footprint C-0603
pins: 1, 2

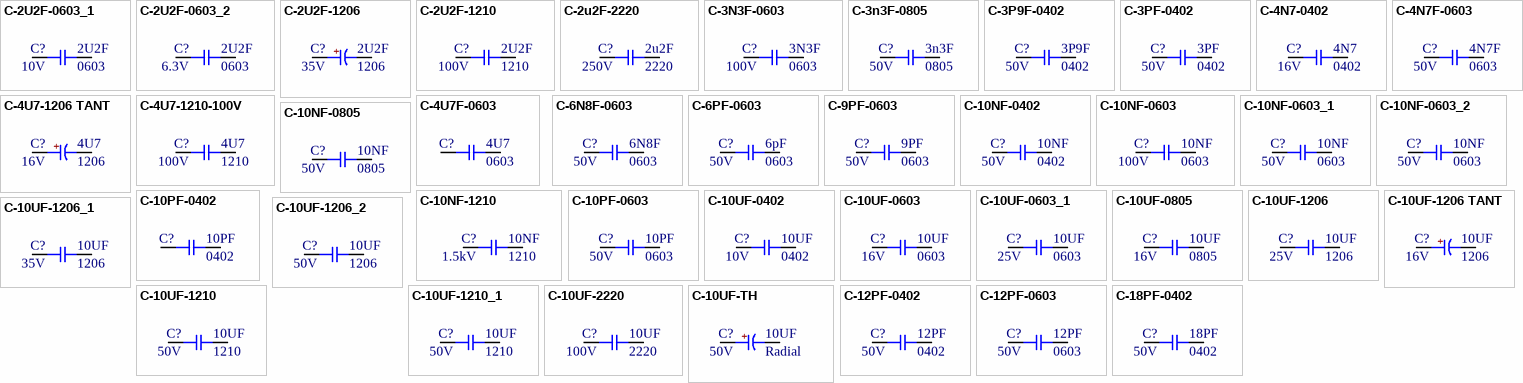
[diagram p1: symbols C-2U2F-0603_1 to C-18PF-0402]

## C-2U2F-0603_1
designator C?, comment 2U2F  Voltage Rating: 10V  Case/Package: 0603